# Altium footprint library HamedLib.PcbLib: 221 footprints (part 13 of 14)
Each footprint in its own frame and in the unit in brackets; x right, y up, seen from the top. Pads: shape width x height; smd on the part's side, far side on the other; paste and mask are expansions set on the pad; w line width, h text height; cw(c..) or ccw(c..) is an arc to the next point about the centre after c.
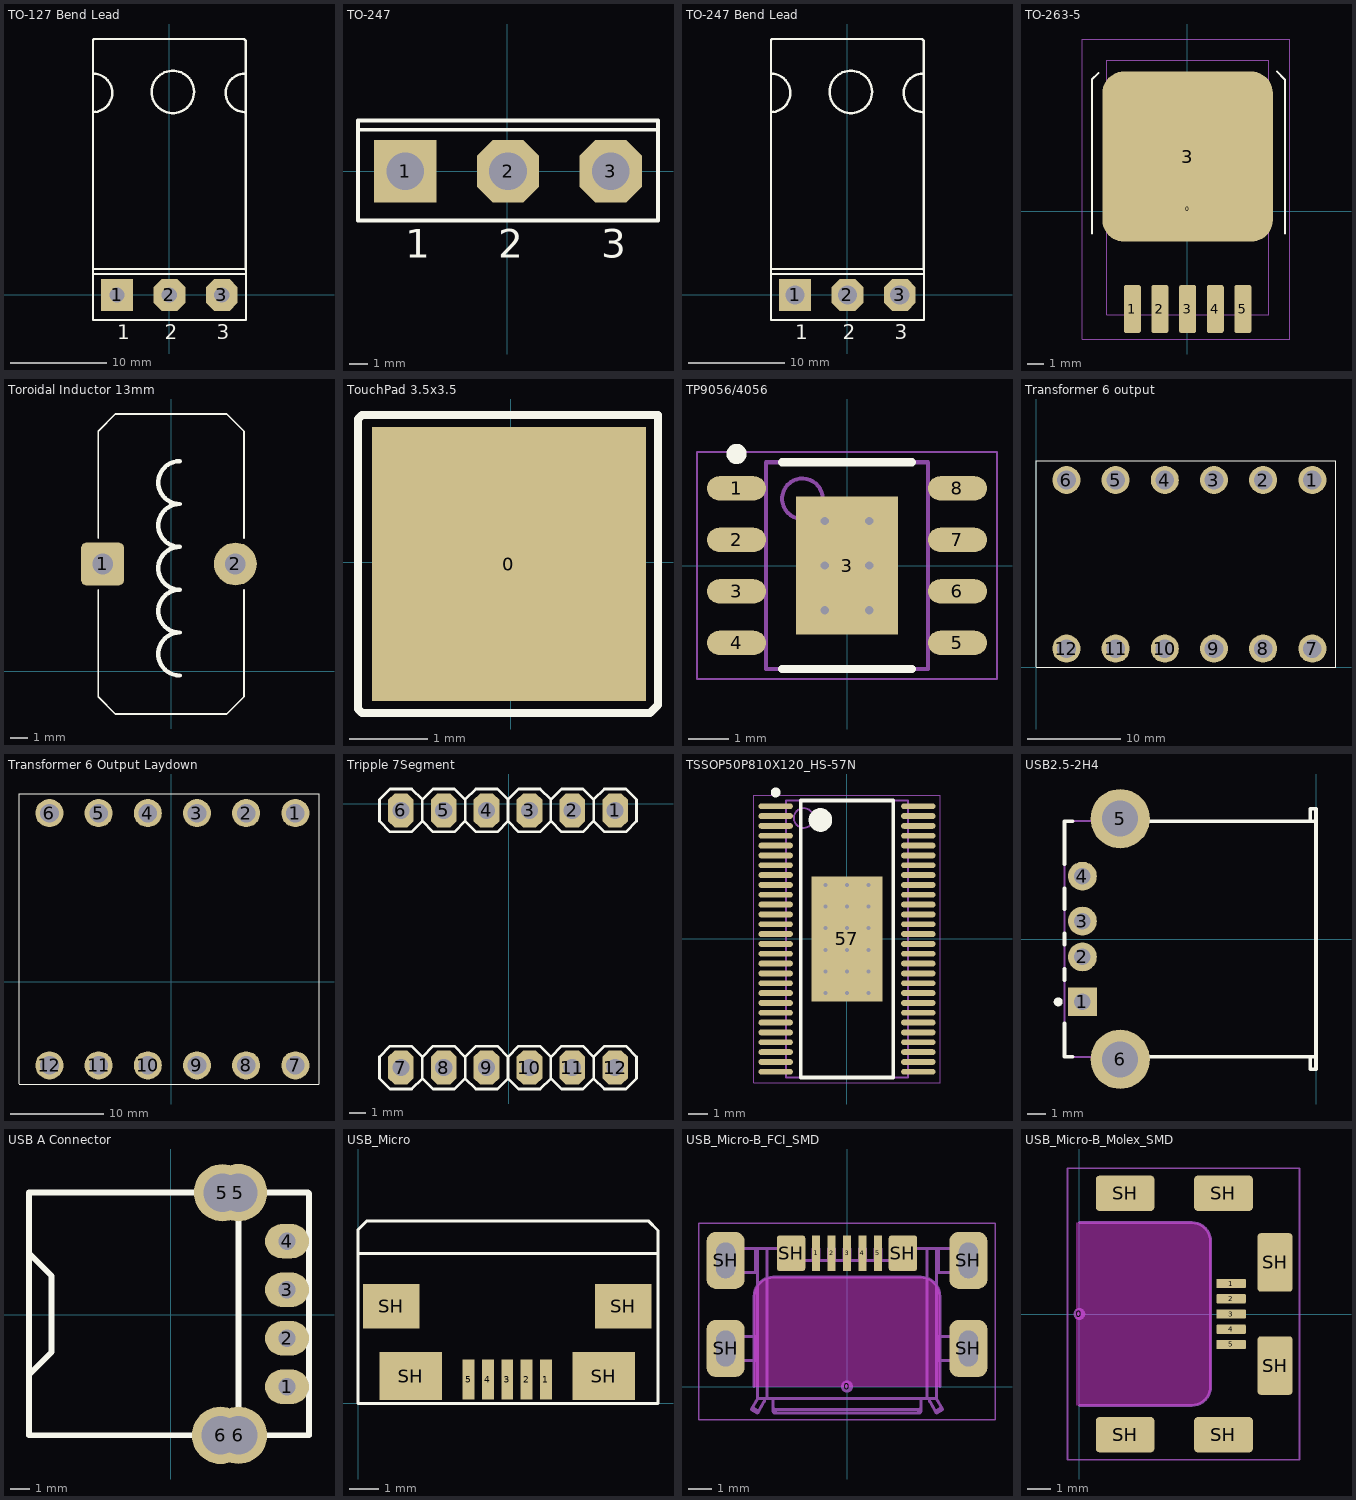
[diagram p12: the footprints below, top view; thin cyan lines are the x and y axes]

## TO-127 Bend Lead [mm] "TO-127 Bend Lead , Suitable for Power Hexfet Mosfets"
pads (3):
  rect 3.3x3.3 hole 1.6: 1(-5.404,-0.014)
  oct 3.3x3.3 hole 1.6: 2(0.046,-0.014) 3(5.496,-0.014)
Top Overlay:
  circle w0.254: c0.4,21.1 r2.202
  lines w0.2: -7.904,2.186 7.996,2.186 ; -7.904,-2.614 7.996,-2.614 7.996,2.686 -7.904,2.686 -7.904,-2.614
  lines w0.254: -7.902,19 ccw(c-7.9,21) -7.854,22.999 ; -7.9,2.7 -7.9,26.5 -7.8,26.6 7.8,26.6 8,26.4 8,2.6 ; 7.854,19.001 cw(c7.9,21) 7.902,23
  text "1" at -5.404,-4.589 h1.5
  text "2" at -0.462,-4.589 h1.5
  text "3" at 4.988,-4.589 h1.5
3D body "TO-247_bent_leads.step": height 2.9, standoff -9.1, extent -7.9,-0.391 8,26.591

## TO-247 [mm] "TO-247"
pads (3):
  rect 3.3x3.3 hole 2: 1(-5.404,-0.014)
  oct 3.3x3.3 hole 2: 2(0.046,-0.014) 3(5.496,-0.014)
Top Overlay:
  lines w0.2: -7.904,2.186 7.996,2.186 ; -7.904,-2.614 7.996,-2.614 7.996,2.686 -7.904,2.686 -7.904,-2.614
  text "1" at -5.404,-4.589 h1.5
  text "2" at -0.462,-4.589 h1.5
  text "3" at 4.988,-4.589 h1.5
3D body "User Library-TO247.STEP": height 24.16, standoff -17.75, extent -8,-2.75 8.26,2.55

## TO-247 Bend Lead [mm] "TO-127 Bend Lead , Suitable for Power Hexfet Mosfets"
pads (3):
  rect 3.3x3.3 hole 2: 1(-5.404,-0.014)
  oct 3.3x3.3 hole 2: 2(0.046,-0.014) 3(5.496,-0.014)
Top Overlay:
  circle w0.254: c0.4,21.1 r2.202
  lines w0.2: -7.904,2.186 7.996,2.186 ; -7.904,-2.614 -7.904,2.686 7.996,2.686 7.996,-2.614 -7.904,-2.614
  lines w0.254: -7.902,19 ccw(c-7.9,21) -7.854,22.999 ; -7.9,2.7 -7.9,26.5 -7.8,26.6 7.8,26.6 8,26.4 8,2.6 ; 7.854,19.001 cw(c7.9,21) 7.902,23
  text "3" at 4.988,-4.589 h1.5
  text "2" at -0.462,-4.589 h1.5
  text "1" at -5.404,-4.589 h1.5
3D body "User Library-TO-247_bent_leads.step": height 2.9, standoff -9.1, extent -7.9,-0.741 8,26.241

## TO-263-5 [mm] "LM2576"
pads (7):
  round 0.5 on Mech15: 0(0.025,0.125)
  rrect25% 1.05x2.95 smd: 1(-3.385,-6.025) 2(-1.68,-6.025) 3(0.025,-6.025) 4(1.73,-6.025) 5(3.435,-6.025)
  rrect25% 10.5x10.5 smd: 3(0.025,3.375)
Top Overlay:
  lines w0.127: -5.875,-1.375 -5.875,8.125 -5.475,8.525 ; 5.525,8.625 6.025,8.125 6.025,-1.375
Mechanical 13:
  lines w0.076: -4.975,-6.365 -4.975,9.305 5.025,9.305 5.025,-6.365 -4.975,-6.365
Mechanical 15:
  lines w0.076: -6.475,-7.875 -6.475,10.625 6.325,10.625 6.325,-7.875 -6.475,-7.875
3D body "TO-263-5.stp": height 4.56, standoff 0, extent -5.055,-6.602 5.105,7.413

## Toroidal Inductor 13mm [mm]
height 5.5
pads (2):
  rrect25% 2.5x2.5 hole 1.2: 1(-4,6.25)
  round 2.5 hole 1.2: 2(3.75,6.25)
Top Overlay:
  lines w0.1: -4.25,4.75 -4.25,-1.5 -3.25,-2.5 3.25,-2.5 4.25,-1.5 4.25,4.75 ; -4.25,7.75 -4.25,14 -3.25,15 3.25,15 4.25,14 4.25,7.75
  lines w0.254: 0.5,-0.25 cw(c0.5,1) 0.5,2.25 cw(c0.5,3.5) 0.5,4.75 cw(c0.5,6) 0.5,7.25 cw(c0.5,8.5) 0.5,9.75 cw(c0.5,11) 0.5,12.25
3D body "Toroid 13MM.stp": height 18.82, standoff -12.8, extent -4.27,-2.443 4.27,14.943

## TouchPad 3.5x3.5 [mm]
pads (1):
  rect 3.5x3.5 smd: 0(-0.025,-0.025)
Top Overlay:
  lines w0.1: -1.956,-1.88 -1.956,1.829 -1.905,1.88 1.88,1.88 1.88,-1.829 1.778,-1.93 -1.905,-1.93 -1.956,-1.88

## TP9056/4056 [mm]
height 1.75
pads (9):
  oval 1.45x0.6 smd: 1(-2.725,1.905) 2(-2.725,0.635) 3(-2.725,-0.635) 4(-2.725,-1.905) 5(2.725,-1.905) 6(2.725,-0.635) 7(2.725,0.635) 8(2.725,1.905)
  rect 2.52x3.41 smd: 3(0,0)
via 0.55,-1.1 diameter 0.5 hole 0.2
via -0.55,-1.1 diameter 0.5 hole 0.2
via 0.55,0 diameter 0.5 hole 0.2
via -0.55,0 diameter 0.5 hole 0.2
via 0.55,1.1 diameter 0.5 hole 0.2
via -0.55,1.1 diameter 0.5 hole 0.2
Top Overlay:
  circle w0.25: c-2.725,2.755 r0.125
  lines w0.2: -1.6,-2.55 1.6,-2.55 ; -1.6,2.55 1.6,2.55
Mechanical 13:
  circle w0.1: c-1.1,1.65 r0.5
  lines w0.1: -2,-2.55 2,-2.55 2,2.55 -2,2.55 -2,-2.55
Mechanical 15:
  lines w0.05: -3.7,-2.8 3.7,-2.8 3.7,2.8 -3.7,2.8 -3.7,-2.8
  lines w0.1: -0.5,0 0.5,0 ; 0,-0.5 0,0.5
3D body "SOIC127P600-8N.step": height 1.75, standoff 0, extent -3,-2.55 3,2.55

## Transformer 6 output [mm]
pads (12):
  round 3 hole 2: 1(29.5,20) 2(24.25,20) 3(19,20) 4(13.75,20) 5(8.5,20) 6(3.25,20) 7(29.5,2) 8(24.25,2) 9(19,2) 10(13.75,2) 11(8.5,2) 12(3.25,2)
Top Overlay:
  lines w0.1: 0,0 32,0 ; 0,0.05 0,22.05 ; 0.025,22.075 32.025,22.075 ; 32.025,0 32.025,22

## Transformer 6 Output Laydown [mm]
pads (12):
  round 3 hole 2: 1(13.25,17.975) 2(8,17.975) 3(2.75,17.975) 4(-2.5,17.975) 5(-7.75,17.975) 6(-13,17.975) 7(13.25,-8.95) 8(8,-8.95) 9(2.75,-8.95) 10(-2.5,-8.95) 11(-7.75,-8.95) 12(-13,-8.95)
Top Overlay:
  lines w0.1: -16.25,-10.95 15.75,-10.95 ; -16.25,-10.9 -16.25,20.025 15.775,20.025 15.775,-10.95

## Tripple 7Segment [mil]
height 748.03
pads (12):
  oct 60x80 hole 40: 1(248,-16) 2(148,-16) 3(48,-16) 4(-52,-16) 5(-152,-16) 6(-252,-16) 7(-251.98,-616.24) 8(-151.98,-616.24) 9(-51.98,-616.24) 10(48.02,-616.24) 11(148.02,-616.24) 12(248.02,-616.24)
Top Overlay:
  region: -141.98,-606.24 -161.98,-606.24 -161.98,-626.24 -141.98,-626.24
  region: -41.98,-606.24 -61.98,-606.24 -61.98,-626.24 -41.98,-626.24
  region: 58.02,-606.24 38.02,-606.24 38.02,-626.24 58.02,-626.24
  region: 158.02,-606.24 138.02,-606.24 138.02,-626.24 158.02,-626.24
  region: 258.02,-606.24 238.02,-606.24 238.02,-626.24 258.02,-626.24
  region: -241.98,-606.24 -261.98,-606.24 -261.98,-626.24 -241.98,-626.24
  region: -242,-6 -262,-6 -262,-26 -242,-26
  region: 258,-6 238,-6 238,-26 258,-26
  region: 158,-6 138,-6 138,-26 158,-26
  region: 58,-6 38,-6 38,-26 58,-26
  region: -42,-6 -62,-6 -62,-26 -42,-26
  region: -142,-6 -162,-6 -162,-26 -142,-26
  lines w6: -201.98,-641.24 -176.98,-666.24 -126.98,-666.24 -101.98,-641.24 ; -201.98,-641.24 -201.98,-591.24 ; -201.98,-641.24 -226.98,-666.24 -276.98,-666.24 -301.98,-641.24 -301.98,-591.24 -276.98,-566.24 -226.98,-566.24 -201.98,-591.24 ; -201.98,-591.24 -176.98,-566.24 -126.98,-566.24 -101.98,-591.24 ; -202,-41 -227,-66 -277,-66 -302,-41 -302,9 -277,34 -227,34 -202,9 ; -202,-41 -202,9 ; -202,-41 -177,-66 -127,-66 -102,-41 ; -202,9 -177,34 -127,34 -102,9 ; -101.98,-641.24 -76.98,-666.24 -26.98,-666.24 -1.98,-641.24 ; -101.98,-641.24 -101.98,-591.24 ; -101.98,-591.24 -76.98,-566.24 -26.98,-566.24 -1.98,-591.24 ; -102,-41 -102,9 ; -102,-41 -77,-66 -27,-66 -2,-41 ; -102,9 -77,34 -27,34 -2,9 ; -1.98,-641.24 23.02,-666.24 73.02,-666.24 98.02,-641.24 ; -1.98,-641.24 -1.98,-591.24 ; -1.98,-591.24 23.02,-566.24 73.02,-566.24 98.02,-591.24 ; -2,-41 -2,9 ; -2,-41 23,-66 73,-66 98,-41 ; -2,9 23,34 73,34 98,9 ; 98.02,-641.24 123.02,-666.24 173.02,-666.24 198.02,-641.24 ; 98.02,-641.24 98.02,-591.24 ; 98.02,-591.24 123.02,-566.24 173.02,-566.24 198.02,-591.24 ; 98,-41 98,9 ; 98,-41 123,-66 173,-66 198,-41 ; 98,9 123,34 173,34 198,9 ; 198.02,-641.24 223.02,-666.24 273.02,-666.24 298.02,-641.24 298.02,-591.24 273.02,-566.24 223.02,-566.24 198.02,-591.24 ; 198.02,-641.24 198.02,-591.24 ; 198,-41 198,9 ; 198,-41 223,-66 273,-66 298,-41 298,9 273,34 223,34 198,9
3D body "tripple 7segment2.STEP": height 476.38, standoff 196.85, extent -749.02,-691.93 747.05,56.1

## TSSOP50P810X120_HS-57N [mm] "TSSOP, 56-Leads, Body 14.00x6.10mm, Pitch 0.50mm, Thermal Pad 6.35.2x3.61.2mm, IPC Medium Density"
height 1.2
pads (57):
  oval 1.75x0.3 smd: 1(-3.625,6.75) 2(-3.625,6.25) 3(-3.625,5.75) 4(-3.625,5.25) 5(-3.625,4.75) 6(-3.625,4.25) 7(-3.625,3.75) 8(-3.625,3.25) 9(-3.625,2.75) 10(-3.625,2.25) 11(-3.625,1.75) 12(-3.625,1.25) 13(-3.625,0.75) 14(-3.625,0.25) 15(-3.625,-0.25) 16(-3.625,-0.75) 17(-3.625,-1.25) 18(-3.625,-1.75) 19(-3.625,-2.25) 20(-3.625,-2.75) 21(-3.625,-3.25) 22(-3.625,-3.75) 23(-3.625,-4.25) 24(-3.625,-4.75) 25(-3.625,-5.25) 26(-3.625,-5.75) 27(-3.625,-6.25) 28(-3.625,-6.75) 29(3.625,-6.75) 30(3.625,-6.25) 31(3.625,-5.75) 32(3.625,-5.25) 33(3.625,-4.75) 34(3.625,-4.25) 35(3.625,-3.75) 36(3.625,-3.25) 37(3.625,-2.75) 38(3.625,-2.25) 39(3.625,-1.75) 40(3.625,-1.25) 41(3.625,-0.75) 42(3.625,-0.25) 43(3.625,0.25) 44(3.625,0.75) 45(3.625,1.25) 46(3.625,1.75) 47(3.625,2.25) 48(3.625,2.75) 49(3.625,3.25) 50(3.625,3.75) 51(3.625,4.25) 52(3.625,4.75) 53(3.625,5.25) 54(3.625,5.75) 55(3.625,6.25) 56(3.625,6.75)
  rect 3.61x6.35 smd: 57(0,0)
via -1.1,2.75 diameter 0.5 hole 0.2
via 0,2.75 diameter 0.5 hole 0.2
via 1.1,2.75 diameter 0.5 hole 0.2
via -1.1,1.65 diameter 0.5 hole 0.2
via 0,1.65 diameter 0.5 hole 0.2
via 1.1,1.65 diameter 0.5 hole 0.2
via -1.1,0.55 diameter 0.5 hole 0.2
via 0,0.55 diameter 0.5 hole 0.2
via 1.1,0.55 diameter 0.5 hole 0.2
via -1.1,-0.55 diameter 0.5 hole 0.2
via 0,-0.55 diameter 0.5 hole 0.2
via 1.1,-0.55 diameter 0.5 hole 0.2
via -1.1,-1.65 diameter 0.5 hole 0.2
via 0,-1.65 diameter 0.5 hole 0.2
via 1.1,-1.65 diameter 0.5 hole 0.2
via -1.1,-2.75 diameter 0.5 hole 0.2
via 0,-2.75 diameter 0.5 hole 0.2
via 1.1,-2.75 diameter 0.5 hole 0.2
Top Overlay:
  circle w0.25: c-3.625,7.45 r0.125
  circle w0.6: c-1.35,6.05 r0.3
  lines w0.2: -2.35,-7.05 -2.35,7.05 2.35,7.05 2.35,-7.05 -2.35,-7.05
Mechanical 13:
  circle w0.1: c-2.2,6.15 r0.5
  lines w0.1: -3.1,-7.05 -3.1,7.05 3.1,7.05 3.1,-7.05 -3.1,-7.05
Mechanical 15:
  lines w0.05: -4.75,-7.3 -4.75,7.3 4.75,7.3 4.75,-7.3 -4.75,-7.3
  lines w0.1: -0.5,0 0.5,0 ; 0,-0.5 0,0.5
3D body "R2T-HTSSOP-56.STEP": height 1.1, standoff 0, extent -4.1,-7 4.1,7

## USB2.5-2H4 [mm] "Connector; USB1.1, Series A, Reverse Type, Thru-Hole; 4 Position; Right Angle"
height 6.5
pads (6):
  rect 1.6x1.6 hole 0.92: 1(-13,-3.5)
  round 1.6 hole 0.92: 2(-13,-1) 3(-13,1) 4(-13,3.5)
  round 3.3 hole 2: 5(-10.9,6.7) 6(-10.9,-6.7)
Top Overlay:
  circle w0.25: c-14.35,-3.5 r0.125
  lines w0.2: -14,-4.7 -14,-6.565 -13.55,-6.565 ; -14,-2.3 -14,-1.67 ; -14,-0.33 -14,0.33 ; -14,1.67 -14,2.83 ; -14,4.17 -14,6.565 -13.55,6.565 ; -9.45,-6.565 0,-6.565 ; -9.45,6.565 0,6.565 ; -0.32,-6.565 -0.32,-7.25 0,-7.25 0,7.25 -0.32,7.25 -0.32,6.565
Mechanical 1:
  lines w0.1: 0,-7.25 0,7.25
  text "PCB Edge" at -0.336,-6.303 h0.25
Mechanical 13:
  lines w0.1: -14,-6.565 -14,6.565 -0.32,6.565 -0.32,7.25 0,7.25 0,-7.25 -0.32,-7.25 -0.32,-6.565 -14,-6.565
3D body "User Library-USB-A-01.step": height 6.95, standoff -4.2, extent -14.1,-8 -0.4,7.8

## USB A Connector [mm]
pads (8):
  oval 2.3x1.8 hole 0.9: 1(6.077,-3.759) 2(6.077,-1.219) 3(6.077,1.321) 4(6.077,3.861)
  round 3 hole 2: 5(2.7,6.4) 5(3.537,6.401) 6(2.6,-6.3) 6(3.537,-6.299)
Top Overlay:
  lines w0.305: 3.537,-5.537 3.537,5.639 ; -7.425,-3.124 -7.425,3.226 ; -7.425,-3.124 -6.242,-1.941 -6.242,2.043 -7.425,3.226 ; -7.425,-3.124 -7.425,-6.299 7.22,-6.299 7.22,6.361 7.18,6.401 -7.425,6.401 -7.425,3.226
3D body "SW3dPS-USB Series A Plug.STEP": height 4.5, standoff 0, extent -14.01,-5.865 4.32,6.135

## USB_Micro [mm]
pads (9):
  rect 0.4x1.35 smd: 1(6.323,0.806) 2(5.673,0.806) 3(5.023,0.806) 4(4.373,0.806) 5(3.723,0.806)
  rect 1.9x1.5 smd: SH(1.125,3.275) SH(8.925,3.275)
  rect 2.1x1.6 smd: SH(1.773,0.925) SH(8.273,0.925)
Top Overlay:
  lines w0.1: 0.025,5.05 10.075,5.05 ; 0,0 0,5.85 0.3,6.15 9.775,6.15 10.1,5.825 10.1,0 0,0
3D body "User Library-MicroAB.STEP": height 2.64, standoff -0.36, extent 0.625,0.425 9.425,6.025

## USB_Micro-B_FCI_SMD [mm]
height 2.286
pads (12):
  round 0.508 on Mech15: 0(0,0)
  rrect20% 0.35x1.5 smd: 1(-1.3,5.6) 2(-0.65,5.6) 3(0,5.6) 4(0.65,5.6) 5(1.3,5.6)
  rrect50% 1.6x2.4 hole 0.8 slot 1.5 at 90 deg: SH(-5.1,1.6) SH(-5.1,5.3) SH(5.1,1.6) SH(5.1,5.3)
  rrect20% 1.2x1.5 smd: SH(-2.35,5.6) SH(2.35,5.6)
Top Solder:
  region: 1.905,4.826 1.905,6.35 -1.905,6.35 -1.905,4.826
Keep-Out Layer:
  board cut-out: -3.9,0 -3.9,3.797 -3.9,3.875 -3.869,4.03 -3.809,4.175 -3.721,4.307 -3.61,4.418 -3.479,4.505 -3.333,4.566 -3.179,4.597 -3.1,4.597 3.1,4.597 3.179,4.597 3.333,4.566 3.479,4.505 3.61,4.418 3.721,4.307 3.809,4.175 3.869,4.03 3.9,3.875 3.9,3.797 3.9,0
Mechanical 13:
  lines w0.127: -4.85,1.1 -4.85,2.1 ; -4.85,4.8 -4.85,5.8 ; -3.97,-0.881 -3.71,-1.031 ; -3.85,1.1 -3.85,2.1 ; -3.85,4.8 -3.85,5.8 ; -3.75,1.1 -5.25,1.1 -5.25,2.1 -3.75,2.1 ; -3.75,4.8 -5.25,4.8 -5.25,5.8 -2.577,5.8 cw(c-2.577,5.6) -2.443,5.748 -2.007,5.352 ccw(c-1.873,5.5) -1.873,5.3 1.873,5.3 ccw(c1.873,5.5) 2.007,5.352 2.443,5.748 cw(c2.577,5.6) 2.577,5.8 5.25,5.8 5.25,4.8 3.75,4.8 ; -3.75,5.8 -3.75,-0.5 ; -3.45,-0.5 cw(c-3.75,-0.501) -3.49,-0.651 -3.76,-1.118 -4.02,-0.968 -3.75,-0.5 ; -3.35,-0.5 -3.35,5.8 ; -3.1,-0.881 ccw(c-3.006,-0.874) -3,-0.968 ; -2.526,5.793 -2.526,5.8 ; -2.229,5.553 ccw(c-2.275,5.8) -2.024,5.8 -1.825,5.8 -1.825,5.3 ; -1.425,5.3 -1.425,5.8 -1.175,5.8 -1.175,5.3 ; -0.775,5.3 -0.775,5.8 -0.525,5.8 -0.525,5.3 ; -0.125,5.3 -0.125,5.8 0.125,5.8 0.125,5.3 ; 0.525,5.3 0.525,5.8 0.775,5.8 0.775,5.3 ; 1.175,5.3 1.175,5.8 1.425,5.8 1.425,5.3 ; 1.825,5.3 1.825,5.8 2.024,5.8 ccw(c2.275,5.8) 2.229,5.553 ; 2.526,5.793 2.526,5.8 ; 3.1,-0.881 cw(c3.006,-0.874) 3,-0.968 ; 3.35,-0.5 3.35,5.8 ; 3.45,-0.5 ccw(c3.75,-0.501) 3.49,-0.651 3.76,-1.118 4.02,-0.968 3.75,-0.5 ; 3.71,-1.031 3.97,-0.881 ; 3.75,1.1 5.25,1.1 5.25,2.1 3.75,2.1 ; 3.75,5.8 3.75,-0.5 ; 3.85,1.1 3.85,2.1 ; 3.85,4.8 3.85,5.8 ; 4.85,1.1 4.85,2.1 ; 4.85,4.8 4.85,5.8 ; -3.75,-0.5 -3.1,-0.5 ; -3.1,-0.5 -3.1,-1.031 ccw(c-3.006,-1.024) -3,-1.118 ; -3.1,-0.5 3.1,-0.501 ; -3,-1.118 -3,-0.968 ; -3,-1.118 3,-1.118 ; -3,-0.968 3,-0.968 ; 3,-1.118 ccw(c3.006,-1.024) 3.1,-1.031 3.1,-0.5 ; 3,-1.118 3,-0.968 ; 3.1,-0.5 3.75,-0.5
Mechanical 15:
  lines w0.076: -6.223,-1.397 6.223,-1.397 6.223,6.858 -6.223,6.858 -6.223,-1.397
  lines w0.127: -3.9,0 -3.9,3.797 cw(c-3.1,3.797) -3.1,4.597 3.1,4.597 cw(c3.1,3.797) 3.9,3.797 3.9,0
3D body "Micro USB B-type mid-mount FCI.STEP": height 2.15, standoff -0.92, extent -5.25,-1.118 5.25,5.8

## USB_Micro-B_Molex_SMD [mm]
height 1.2
pads (12):
  round 0.508 on Mech15: 0(0,0)
  rrect20% 1.25x0.4 smd: 1(6.475,1.3) 2(6.475,0.65) 3(6.475,0) 4(6.475,-0.65) 5(6.475,-1.3)
  rrect20% 2.5x1.5 smd: SH(1.95,-5.15) SH(1.95,5.15) SH(6.15,-5.15) SH(6.15,5.15)
  rrect20% 1.5x2.5 smd: SH(8.35,-2.2) SH(8.35,2.2)
Top Solder:
  rectangle: 5.842,-1.27 7.112,1.27
Keep-Out Layer:
  board cut-out: -0.127,3.9 4.8,3.9 4.879,3.9 5.033,3.869 5.179,3.809 5.31,3.721 5.421,3.61 5.509,3.479 5.569,3.333 5.6,3.179 5.6,3.1 5.6,-3.1 5.6,-3.179 5.569,-3.333 5.509,-3.479 5.421,-3.61 5.31,-3.721 5.179,-3.809 5.033,-3.869 4.879,-3.9 4.8,-3.9 -0.127,-3.9
Mechanical 13:
  lines w0.127: 0,-3.9 4.8,-3.9 ccw(c4.8,-3.1) 5.6,-3.1 5.6,3.1 ccw(c4.8,3.1) 4.8,3.9 0,3.9
Mechanical 15:
  lines w0.076: -0.5,-6.223 -0.5,6.223 9.398,6.223 9.398,-6.223 -0.5,-6.223
3D body "Micro USB B Receptacle Middle Mount.STEP": height 1.43, standoff -1.52, extent -0.43,-5.5 8.7,5.5